# Altium footprint library MU_MP_39_V1.PcbLib: 76 footprints (part 3 of 5)
Each footprint in its own frame and in the unit in brackets; x right, y up, seen from the top. Pads: shape width x height; smd on the part's side, far side on the other; paste and mask are expansions set on the pad; w line width, h text height; cw(c..) or ccw(c..) is an arc to the next point about the centre after c.
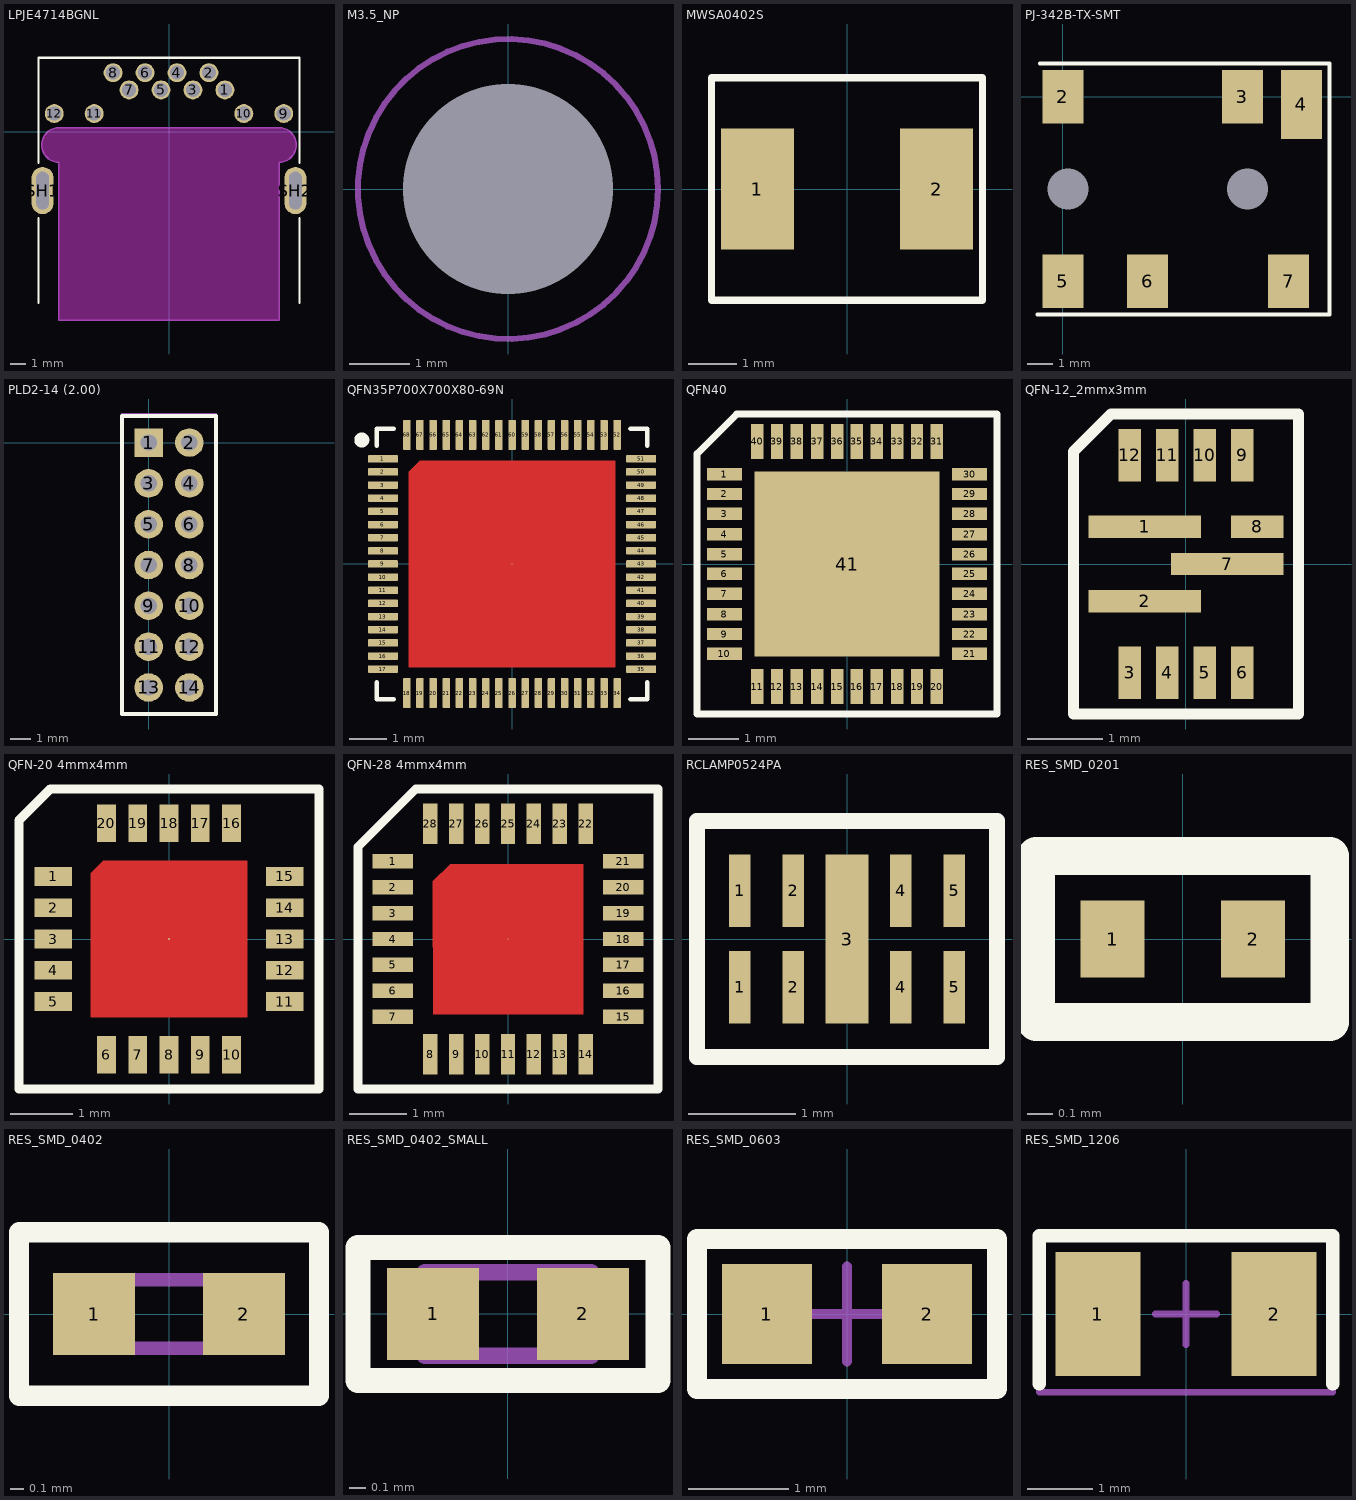
[diagram p2: the footprints below, top view; thin cyan lines are the x and y axes]

## LPJE4714BGNL [mm]
pads (14):
  round 1.2 hole 0.9: 1(3.556,2.65) 2(2.54,3.75) 3(1.524,2.65) 4(0.508,3.75) 5(-0.508,2.65) 6(-1.524,3.75) 7(-2.54,2.65) 8(-3.556,3.75) 9(7.3,1.15) 10(4.76,1.15) 11(-4.76,1.15) 12(-7.3,1.15)
  oval 1.4x3 hole 0.8 slot 2.4 at 90 deg: SH1(-8.04,-3.75) SH2(8.04,-3.75)
Top Overlay:
  lines w0.15: -8.3,-10.9 -8.3,-5.5 ; -8.3,-2 -8.3,4.7 8.3,4.7 8.3,-2 ; 8.3,-10.9 8.3,-5.5
Keep-Out Layer:
  board cut-out: -7,-12 7,-12 7,-1.95 7.145,-1.95 7.425,-1.875 7.675,-1.73 7.88,-1.525 8.025,-1.275 8.1,-0.995 8.1,-0.705 8.025,-0.425 7.88,-0.175 7.675,0.03 7.425,0.175 7.145,0.25 7,0.25 -7,0.25 -7.145,0.25 -7.425,0.175 -7.675,0.03 -7.88,-0.175 -8.025,-0.425 -8.1,-0.705 -8.1,-0.995 -8.025,-1.275 -7.88,-1.525 -7.675,-1.73 -7.425,-1.875 -7.145,-1.95 -7,-1.95
Mechanical 15:
  lines w0.1: -7,-12 7,-12 7,-1.95 ccw(c7,-0.85) 7,0.25 -7,0.25 ccw(c-7,-0.85) -7,-1.95 -7,-12
3D body "RJ45 Connector_LPJE4714BGNL (2).STEP": height 6.95, standoff -4.15, extent -8.2,-11.7 8.2,3.935

## M3.5_NP [mm]
pads (1):
  round 0 hole 3.5 unplated: 1(0,0)
Mechanical 1:
  circle w0.1: c0,0 r1.3
Mechanical 15:
  circle w0.1: c0,0 r2.5
Multi-Layer:
  pour cut-out: 0,-2.5 -0.246,-2.5 -0.729,-2.404 -1.184,-2.216 -1.594,-1.942 -1.942,-1.594 -2.216,-1.184 -2.404,-0.729 -2.5,-0.246 -2.5,0 -2.5,0.246 -2.404,0.729 -2.216,1.184 -1.942,1.594 -1.594,1.942 -1.184,2.216 -0.729,2.404 -0.246,2.5 0,2.5 0.246,2.5 0.729,2.404 1.184,2.216 1.594,1.942 1.942,1.594 2.216,1.184 2.404,0.729 2.5,0.246 2.5,0 2.5,-0.246 2.404,-0.729 2.216,-1.184 1.942,-1.594 1.594,-1.942 1.184,-2.216 0.729,-2.404 0.246,-2.5

## MWSA0402S [mm]
pads (2):
  rect 1.5x2.5 smd: 1(-1.85,0) 2(1.85,0)
Top Overlay:
  lines w0.15: -2.8,-2.3 2.8,-2.3 2.8,2.3 -2.8,2.3 -2.8,-2.3
3D body "User Library-MWSA0402S.STEP": height 1.8, standoff 0, extent -2.4,-2.1 2.4,2.1

## PJ-342B-TX-SMT [mm]
pads (8):
  rect 1.6x2.1 smd: 2(0,0) 3(7,0) 5(0,-7.2) 6(3.3,-7.2) 7(8.8,-7.2)
  rect 1.6x2.7 smd: 4(9.3,-0.3)
  round 0 hole 1.6: ""(0.2,-3.6) ""(7.2,-3.6)
Top Overlay:
  lines w0.15: -1,-8.5 10.4,-8.5 10.4,1.3 -0.9,1.3
Multi-Layer:
  pour cut-out: 6,-3.6 6,-3.718 6.046,-3.95 6.137,-4.168 6.268,-4.365 6.435,-4.532 6.632,-4.663 6.85,-4.754 7.082,-4.8 7.2,-4.8 7.318,-4.8 7.55,-4.754 7.768,-4.663 7.965,-4.532 8.132,-4.365 8.263,-4.168 8.354,-3.95 8.4,-3.718 8.4,-3.6 8.4,-3.482 8.354,-3.25 8.263,-3.032 8.132,-2.835 7.965,-2.668 7.768,-2.537 7.55,-2.446 7.318,-2.4 7.2,-2.4 7.082,-2.4 6.85,-2.446 6.632,-2.537 6.435,-2.668 6.268,-2.835 6.137,-3.032 6.046,-3.25 6,-3.482
  pour cut-out: -1,-3.6 -1,-3.718 -0.954,-3.95 -0.863,-4.168 -0.732,-4.365 -0.565,-4.532 -0.368,-4.663 -0.15,-4.754 0.082,-4.8 0.2,-4.8 0.318,-4.8 0.55,-4.754 0.768,-4.663 0.965,-4.532 1.132,-4.365 1.263,-4.168 1.354,-3.95 1.4,-3.718 1.4,-3.6 1.4,-3.482 1.354,-3.25 1.263,-3.032 1.132,-2.835 0.965,-2.668 0.768,-2.537 0.55,-2.446 0.318,-2.4 0.2,-2.4 0.082,-2.4 -0.15,-2.446 -0.368,-2.537 -0.565,-2.668 -0.732,-2.835 -0.863,-3.032 -0.954,-3.25 -1,-3.482
3D body "PJ311D_WPos.STEP": height 4.8, standoff -0.7, extent -4.15,-7.9 10.15,0.6

## PLD2-14 (2.00) [mm]
pads (14):
  rect 1.4x1.4 hole 0.8: 1(0,0)
  round 1.4 hole 0.8: 2(2,0) 3(0,-2) 4(2,-2) 5(0,-4) 6(2,-4) 7(0,-6) 8(2,-6) 9(0,-8) 10(2,-8) 11(0,-10) 12(2,-10) 13(0,-12) 14(2,-12)
Top Overlay:
  lines w0.2: -1.3,-13.3 3.3,-13.3 3.3,1.3 -1.3,1.3 -1.3,-13.3
Mechanical 1:
  lines w0.1: -1.3,-13.3 3.3,-13.3 3.3,1.27 -1.3,1.27 -1.3,-13.3
Mechanical 15:
  lines w0.1: -1.3,-13.3 3.3,-13.3 3.3,1.4 -1.3,1.4 -1.3,-13.3

## QFN35P700X700X80-69N [mm]
pads (69):
  rrect25% 0.8x0.2 smd mask+0.05: 1(-3.435,2.8) 2(-3.435,2.45) 3(-3.435,2.1) 4(-3.435,1.75) 5(-3.435,1.4) 6(-3.435,1.05) 7(-3.435,0.7) 8(-3.435,0.35) 9(-3.435,0) 10(-3.435,-0.35) 11(-3.435,-0.7) 12(-3.435,-1.05) 13(-3.435,-1.4) 14(-3.435,-1.75) 15(-3.435,-2.1) 16(-3.435,-2.45) 17(-3.435,-2.8) 35(3.435,-2.8) 36(3.435,-2.45) 37(3.435,-2.1) 38(3.435,-1.75) 39(3.435,-1.4) 40(3.435,-1.05) 41(3.435,-0.7) 42(3.435,-0.35) 43(3.435,0) 44(3.435,0.35) 45(3.435,0.7) 46(3.435,1.05) 47(3.435,1.4) 48(3.435,1.75) 49(3.435,2.1) 50(3.435,2.45) 51(3.435,2.8)
  rrect25% 0.2x0.8 smd mask+0.05: 18(-2.8,-3.435) 19(-2.45,-3.435) 20(-2.1,-3.435) 21(-1.75,-3.435) 22(-1.4,-3.435) 23(-1.05,-3.435) 24(-0.7,-3.435) 25(-0.35,-3.435) 26(0,-3.435) 27(0.35,-3.435) 28(0.7,-3.435) 29(1.05,-3.435) 30(1.4,-3.435) 31(1.75,-3.435) 32(2.1,-3.435) 33(2.45,-3.435) 34(2.8,-3.435) 52(2.8,3.435) 53(2.45,3.435) 54(2.1,3.435) 55(1.75,3.435) 56(1.4,3.435) 57(1.05,3.435) 58(0.7,3.435) 59(0.35,3.435) 60(0,3.435) 61(-0.35,3.435) 62(-0.7,3.435) 63(-1.05,3.435) 64(-1.4,3.435) 65(-1.75,3.435) 66(-2.1,3.435) 67(-2.45,3.435) 68(-2.8,3.435)
  round 0.025 smd paste-4 mask+0.05: 69(0,0)
Top Layer:
  region: -2.45,2.75 -2.75,2.45 -2.75,-2.75 2.75,-2.75 2.75,2.75
Top Overlay:
  circle w0.2: c-4,3.3 r0.1
  lines w0.127: -3.6,-3.15 -3.6,-3.6 -3.15,-3.6 ; -3.6,3.15 -3.6,3.6 -3.15,3.6 ; 3.15,-3.6 3.6,-3.6 3.6,-3.15 ; 3.15,3.6 3.6,3.6 3.6,3.15
Top Paste:
  region: 1.407,-1.41 -1.41,-1.41 -1.41,1.407 1.407,1.407
Top Solder:
  rectangle: -3.885,-2.855 -2.985,2.852
  rectangle: -2.861,-3.885 2.85,-2.985
  rectangle: -2.81,2.984 2.829,3.885
  rectangle: 2.985,-2.802 3.885,2.792
3D body "User Library-QFN68_RK808.STEP": height 0.79, standoff 0, extent -3.525,-3.525 3.525,3.525

## QFN40 [mm]
pads (41):
  rect 0.7x0.25 smd mask+0.05: 1(-2.45,1.8) 2(-2.45,1.4) 3(-2.45,1) 4(-2.45,0.6) 5(-2.45,0.2) 6(-2.45,-0.2) 7(-2.45,-0.6) 8(-2.45,-1) 9(-2.45,-1.4) 10(-2.45,-1.8) 21(2.45,-1.8) 22(2.45,-1.4) 23(2.45,-1) 24(2.45,-0.6) 25(2.45,-0.2) 26(2.45,0.2) 27(2.45,0.6) 28(2.45,1) 29(2.45,1.4) 30(2.45,1.8)
  rect 0.25x0.7 smd mask+0.05: 11(-1.8,-2.45) 12(-1.4,-2.45) 13(-1,-2.45) 14(-0.6,-2.45) 15(-0.2,-2.45) 16(0.2,-2.45) 17(0.6,-2.45) 18(1,-2.45) 19(1.4,-2.45) 20(1.8,-2.45) 31(1.8,2.45) 32(1.4,2.45) 33(1,2.45) 34(0.6,2.45) 35(0.2,2.45) 36(-0.2,2.45) 37(-0.6,2.45) 38(-1,2.45) 39(-1.4,2.45) 40(-1.8,2.45)
  rect 3.7x3.7 smd mask+0.05: 41(0,0)
Top Overlay:
  lines w0.15: -3,-3 3,-3 3,3 -2.2,3 -3,2.2 -3,-3
Top Solder:
  rectangle: -1.975,2.05 1.975,2.85
  rectangle: 2.05,-1.975 2.85,1.975
  rectangle: -1.975,-2.85 1.975,-2.05
  rectangle: -2.85,-1.975 -2.05,1.975
3D body "User Library-QFN40_500_500_090_360P040.STEP": height 0.9, standoff 0, extent -2.505,-2.505 2.505,2.505

## QFN-12_2mmx3mm [mm]
pads (12):
  rect 1.5x0.3 smd mask+0.05: 1(-0.55,0.5) 2(-0.55,-0.5) 7(0.55,0)
  rect 0.3x0.7 smd mask+0.05: 3(-0.75,-1.45) 4(-0.25,-1.45) 5(0.25,-1.45) 6(0.75,-1.45) 9(0.75,1.45) 10(0.25,1.45) 11(-0.25,1.45) 12(-0.75,1.45)
  rect 0.7x0.3 smd mask+0.05: 8(0.95,0.5)
Top Overlay:
  lines w0.15: -1.5,-2 1.5,-2 1.5,2 -1,2 -1.5,1.5 -1.5,-2
Top Solder:
  rectangle: -0.775,1.05 0.8,1.85
  rectangle: -0.775,-1.85 0.825,-1.05
3D body "User Library-QFN-12(NB679).STEP": height 1, standoff 0, extent -1.03,-1.53 1.03,1.53

## QFN-20 4mmx4mm [mm]
pads (21):
  rect 0.6x0.3 smd mask+0.05: 1(-1.85,1) 2(-1.85,0.5) 3(-1.85,0) 4(-1.85,-0.5) 5(-1.85,-1) 11(1.85,-1) 12(1.85,-0.5) 13(1.85,0) 14(1.85,0.5) 15(1.85,1)
  rect 0.3x0.6 smd mask+0.05: 6(-1,-1.85) 7(-0.5,-1.85) 8(0,-1.85) 9(0.5,-1.85) 10(1,-1.85) 16(1,1.85) 17(0.5,1.85) 18(0,1.85) 19(-0.5,1.85) 20(-1,1.85)
  round 0.025 smd mask+0.05: 21(0,0)
Top Layer:
  region: 1.25,1.25 -1.05,1.25 -1.25,1.05 -1.25,-1.25 1.25,-1.25
Top Overlay:
  lines w0.15: -2.4,-2.4 -2.4,1.9 -1.9,2.4 2.4,2.4 2.4,-2.4 -2.4,-2.4
Top Solder:
  rectangle: -2.2,-1.075 -1.5,1.025
  rectangle: -1.025,-2.2 1.05,-1.5
  rectangle: 1.5,-0.975 2.2,1
  rectangle: -1.075,1.5 0.975,2.2
3D body "User Library-QFN20_050.STEP": height 0.9, standoff 0, extent -2.005,-2.005 2.005,2.005

## QFN-28 4mmx4mm [mm]
pads (29):
  rect 0.7x0.25 smd mask+0.05: 1(-2,1.35) 2(-2,0.9) 3(-2,0.45) 4(-2,0) 5(-2,-0.45) 6(-2,-0.9) 7(-2,-1.35) 15(2,-1.35) 16(2,-0.9) 17(2,-0.45) 18(2,0) 19(2,0.45) 20(2,0.9) 21(2,1.35)
  rect 0.25x0.7 smd mask+0.05: 8(-1.35,-2) 9(-0.9,-2) 10(-0.45,-2) 11(0,-2) 12(0.45,-2) 13(0.9,-2) 14(1.35,-2) 22(1.35,2) 23(0.9,2) 24(0.45,2) 25(0,2) 26(-0.45,2) 27(-0.9,2) 28(-1.35,2)
  round 0.025 smd mask+0.05: 29(0,0)
Top Layer:
  region: 1.3,1.3 -1,1.3 -1.3,1 -1.3,-1.3 1.3,-1.3
Top Overlay:
  lines w0.15: -2.6,-2.6 -2.6,1.6 -1.6,2.6 2.6,2.6 2.6,-2.6 -2.6,-2.6
Top Solder:
  rectangle: -1.375,1.6 1.325,2.4
  rectangle: 1.6,-1.35 2.4,1.4
  rectangle: -1.375,-2.4 1.375,-1.6
  rectangle: -2.4,-1.4 -1.6,1.45
3D body "ES8388S--3DModel-STEP-56544.STEP": height 0.8, standoff 0, extent -2,-2 2,2

## RCLAMP0524PA [mm]
pads (9):
  rect 0.2x0.675 smd: 1(-1,-0.45) 1(-1,0.45) 2(-0.5,-0.45) 2(-0.5,0.45) 4(0.5,-0.45) 4(0.5,0.45) 5(1,0.45) 5(1,-0.45)
  rect 0.4x1.575 smd: 3(0,0)
Top Overlay:
  lines w0.15: -1.4,-1.1 -1.4,1.1 1.4,1.1 1.4,-1.1 -1.4,-1.1
Top Solder:
  rectangle: -1.225,-0.9 1.225,0.9
Mechanical 15:
  lines w0.15: -1.4,-1.1 1.4,-1.1 1.4,1.1 -1.4,1.1 -1.4,-1.1
3D body "User Library-SLP2510P8.STEP": height 0.56, standoff -0.03, extent -1.25,-0.505 1.25,0.505

## RES_SMD_0201 [mm]
pads (2):
  rect 0.25x0.3 smd: 1(-0.275,0) 2(0.275,0)
Top Overlay:
  lines w0.15: -0.575,-0.325 -0.575,0.325 0.575,0.325 0.575,-0.325 -0.575,-0.325
Mechanical 15:
  lines w0.1: -0.55,-0.325 0.6,-0.325 0.6,0.325 -0.55,0.325 -0.55,-0.325
3D body "User Library-User Library-RES0201.STEP": height 0.15, standoff 0, extent -0.3,-0.15 0.3,0.15

## RES_SMD_0402 [mm]
pads (2):
  rect 0.6x0.6 smd: 1(-0.55,0) 2(0.55,0)
Top Overlay:
  lines w0.15: -1.1,-0.6 1.1,-0.6 1.1,0.6 -1.1,0.6 -1.1,-0.6
Mechanical 1:
  lines w0.1: -0.5,-0.25 -0.5,0.25 0.5,0.25 0.5,-0.25 -0.5,-0.25
Mechanical 15:
  lines w0.1: -1.1,-0.6 -1.1,0.6 1.1,0.6 1.1,-0.6 -1.1,-0.6
3D body "chip_0402_r.STEP": height 0.34, standoff -0.02, extent -0.525,-0.25 0.475,0.25

## RES_SMD_0402_SMALL [mm]
pads (2):
  rect 0.55x0.55 smd: 1(-0.45,0) 2(0.45,0)
Top Overlay:
  lines w0.15: -0.9,-0.4 0.9,-0.4 0.9,0.4 -0.9,0.4 -0.9,-0.4
Mechanical 1:
  lines w0.1: -0.5,-0.25 -0.5,0.25 0.5,0.25 0.5,-0.25 -0.5,-0.25
Mechanical 15:
  lines w0.1: -0.9,-0.4 -0.9,0.4 0.9,0.4 0.9,-0.4 -0.9,-0.4
3D body "chip_0402_r.STEP": height 0.34, standoff -0.02, extent -0.525,-0.25 0.475,0.25

## RES_SMD_0603 [mm]
pads (2):
  rect 0.9x1 smd: 1(-0.8,0) 2(0.8,0)
Top Overlay:
  lines w0.2: -1.5,-0.75 1.5,-0.75 1.5,0.75 -1.5,0.75 -1.5,-0.75
Mechanical 1:
  lines w0.1: -1.5,-0.75 1.5,-0.75 1.5,0.75 -1.5,0.75 -1.5,-0.75
Mechanical 15:
  lines w0.1: -0.475,0 0.475,0 ; 0,-0.475 0,0.475 ; -1.5,-0.75 -1.5,0.75 1.5,0.75 1.5,-0.75 -1.5,-0.75
3D body "chip_0603_r.STEP": height 0.44, standoff -0.02, extent -0.8,-0.4 0.8,0.4

## RES_SMD_1206 [mm]
pads (2):
  rect 1.3x1.9 smd: 1(-1.35,0) 2(1.35,0)
Top Overlay:
  lines w0.2: -2.25,-1.075 -2.25,1.2 2.25,1.2 2.25,-1.075
Mechanical 1:
  lines w0.1: -2.25,-1.2 -2.25,1.2 2.25,1.2 2.25,-1.2 -2.25,-1.2
Mechanical 15:
  lines w0.1: -0.475,0 0.475,0 ; 0,-0.475 0,0.475 ; -2.25,-1.2 -2.25,1.2 2.225,1.2 2.225,-1.2 -2.25,-1.2
3D body "User Library-RESC3216X06N.STEP": height 0.53, standoff -0.02, extent -1.6,-0.776 1.6,0.824